# Altium footprint library SparkFun-Retired.PCBLIB: 302 footprints (part 16 of 19)
Each footprint in its own frame and in the unit in brackets; x right, y up, seen from the top. Pads: shape width x height; smd on the part's side, far side on the other; paste and mask are expansions set on the pad; w line width, h text height; cw(c..) or ccw(c..) is an arc to the next point about the centre after c.
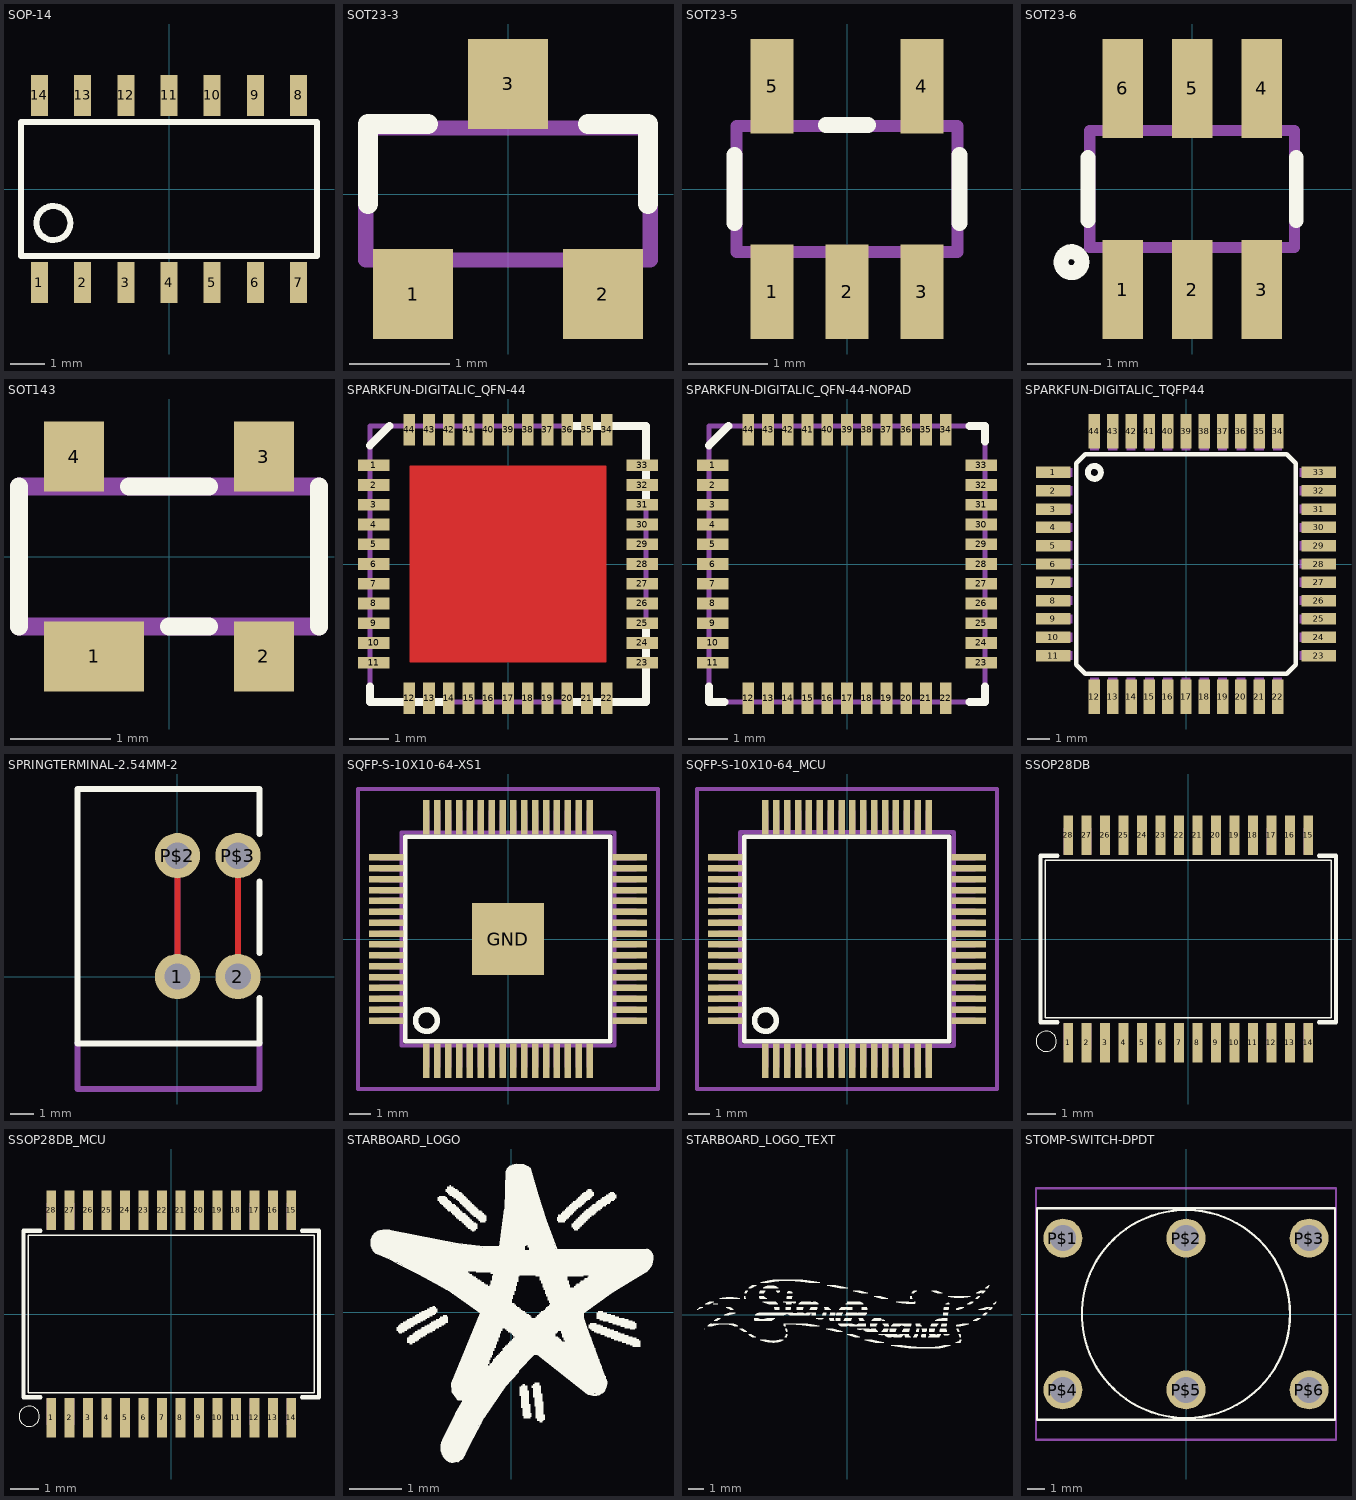
[diagram p15: the footprints below, top view; thin cyan lines are the x and y axes]

## SOP-14 [mil]
pads (14):
  rect 19.69x47.24 smd: 1(-150,-108.27) 2(-100,-108.27) 3(-50,-108.27) 4(0,-108.27) 5(50,-108.27) 6(100,-108.27) 7(150,-108.27) 8(150,108.27) 9(100,108.27) 10(50,108.27) 11(0,108.27) 12(-50,108.27) 13(-100,108.27) 14(-150,108.27)
Top Overlay:
  circle w7: c-133.86,-39.37 r19.69
  lines w7: -171.26,-77.76 171.26,-77.76 171.26,77.76 -171.26,77.76 -171.26,-77.76
Mechanical 16:
  rectangle: -7.87,94.49 7.87,118.11
  rectangle: -57.87,94.49 -42.13,118.11
  rectangle: -107.87,94.49 -92.13,118.11
  rectangle: -157.87,94.49 -142.13,118.11
  rectangle: 42.13,94.49 57.87,118.11
  rectangle: 92.13,94.49 107.87,118.11
  rectangle: 142.13,94.49 157.87,118.11
  region: -142.13,-94.49 -157.87,-94.49 -157.87,-118.11 -142.13,-118.11
  region: -92.13,-94.49 -107.87,-94.49 -107.87,-118.11 -92.13,-118.11
  region: -42.13,-94.49 -57.87,-94.49 -57.87,-118.11 -42.13,-118.11
  region: 7.87,-94.49 -7.87,-94.49 -7.87,-118.11 7.87,-118.11
  region: 57.87,-94.49 42.13,-94.49 42.13,-118.11 57.87,-118.11
  region: 107.87,-94.49 92.13,-94.49 92.13,-118.11 107.87,-118.11
  region: 157.87,-94.49 142.13,-94.49 142.13,-118.11 157.87,-118.11

## SOT23-3 [mil]
pads (3):
  rect 31.5x35.43 smd: 1(-37.4,-39.37) 2(37.4,-39.37) 3(0,43.31)
Top Overlay:
  lines w8: -55.12,-3.94 -55.12,27.56 -31.5,27.56 ; 31.5,27.56 55.12,27.56 55.12,-3.94
Mechanical 16:
  lines w6: -56,-26 56,-26 56,26 -56,26 -56,-26

## SOT23-5 [mil]
pads (5):
  rect 21.65x47.24 smd: 1(-37.4,-51.19) 2(0,-51.19) 3(37.4,-51.19) 4(37.4,51.19) 5(-37.4,51.19)
Top Overlay:
  lines w8: -56,-16.91 -56,16.91 ; -10.57,31.91 10.57,31.91 ; 56,-16.91 56,16.91
Mechanical 16:
  rectangle: -47.24,-59.06 -27.56,-33.46
  rectangle: -9.84,-59.06 9.84,-33.46
  rectangle: 27.56,-59.06 47.24,-33.46
  rectangle: 27.56,33.46 47.24,59.06
  rectangle: -47.24,33.46 -27.56,59.06
  lines w6: -55.12,-31.5 55.12,-31.5 55.12,31.5 -55.12,31.5 -55.12,-31.5

## SOT23-6 [mm]
pads (6):
  rect 0.55x1.35 smd: 1(-0.95,-1.375) 2(0,-1.375) 3(0.95,-1.375) 4(0.95,1.375) 5(0,1.375) 6(-0.95,1.375)
Top Overlay:
  circle w0.203: c-1.65,-1 r0.144
  lines w0.203: -1.422,-0.43 -1.422,0.43 ; 1.422,-0.43 1.422,0.43
Mechanical 16:
  rectangle: -1.2,-1.5 -0.7,-0.85
  rectangle: -0.25,-1.5 0.25,-0.85
  rectangle: 0.7,-1.5 1.2,-0.85
  rectangle: 0.7,0.85 1.2,1.5
  rectangle: -1.2,0.85 -0.7,1.5
  rectangle: -0.25,0.85 0.25,1.5
  lines w0.152: -1.4,-0.8 1.4,-0.8 1.4,0.8 -1.4,0.8 -1.4,-0.8

## SOT143 [mm]
pads (4):
  rect 1x0.7 smd: 1(-0.75,-1)
  rect 0.6x0.7 smd: 2(0.95,-1) 3(0.95,1) 4(-0.95,1)
Top Overlay:
  lines w0.178: -1.5,-0.7 -1.5,0.7 ; -0.4,0.7 0.4,0.7 ; 0,-0.7 0.4,-0.7 ; 1.5,-0.7 1.5,0.7
Mechanical 16:
  lines w0.178: -1.5,-0.7 -1.5,0.7 1.5,0.7 1.5,-0.7 -1.5,-0.7

## SPARKFUN-DIGITALIC_QFN-44 [mil]
pads (44):
  rect 31.5x11.81 smd: 1(-133.86,98.43) 2(-133.86,78.74) 3(-133.86,59.06) 4(-133.86,39.37) 5(-133.86,19.69) 6(-133.86,0) 7(-133.86,-19.69) 8(-133.86,-39.37) 9(-133.86,-59.06) 10(-133.86,-78.74) 11(-133.86,-98.43) 23(133.86,-98.43) 24(133.86,-78.74) 25(133.86,-59.06) 26(133.86,-39.37) 27(133.86,-19.69) 28(133.86,0) 29(133.86,19.69) 30(133.86,39.37) 31(133.86,59.06) 32(133.86,78.74) 33(133.86,98.43)
  rect 11.81x31.5 smd: 12(-98.43,-133.86) 13(-78.74,-133.86) 14(-59.06,-133.86) 15(-39.37,-133.86) 16(-19.69,-133.86) 17(0,-133.86) 18(19.69,-133.86) 19(39.37,-133.86) 20(59.06,-133.86) 21(78.74,-133.86) 22(98.43,-133.86) 34(98.43,133.86) 35(78.74,133.86) 36(59.06,133.86) 37(39.37,133.86) 38(19.69,133.86) 39(0,133.86) 40(-19.69,133.86) 41(-39.37,133.86) 42(-59.06,133.86) 43(-78.74,133.86) 44(-98.43,133.86)
Top Layer:
  rectangle: -98.43,-98.43 98.43,98.43
Top Overlay:
  lines w8: -137.8,-122.05 -137.8,-137.8 -64.96,-137.8 ; -137.8,118.11 -118.11,137.8 ; 64.96,-137.8 137.8,-137.8 137.8,-64.96 ; 64.96,137.8 137.8,137.8 137.8,64.96
Top Solder:
  rectangle: -19.69,-19.69 19.69,19.69
Mechanical 16:
  lines w5: -137.8,-137.8 -137.8,137.8 137.8,137.8 137.8,-137.8 -133.86,-137.8

## SPARKFUN-DIGITALIC_QFN-44-NOPAD [mil]
pads (44):
  rect 31.5x11.81 smd: 1(-133.86,98.43) 2(-133.86,78.74) 3(-133.86,59.06) 4(-133.86,39.37) 5(-133.86,19.69) 6(-133.86,0) 7(-133.86,-19.69) 8(-133.86,-39.37) 9(-133.86,-59.06) 10(-133.86,-78.74) 11(-133.86,-98.43) 23(133.86,-98.43) 24(133.86,-78.74) 25(133.86,-59.06) 26(133.86,-39.37) 27(133.86,-19.69) 28(133.86,0) 29(133.86,19.69) 30(133.86,39.37) 31(133.86,59.06) 32(133.86,78.74) 33(133.86,98.43)
  rect 11.81x31.5 smd: 12(-98.43,-133.86) 13(-78.74,-133.86) 14(-59.06,-133.86) 15(-39.37,-133.86) 16(-19.69,-133.86) 17(0,-133.86) 18(19.69,-133.86) 19(39.37,-133.86) 20(59.06,-133.86) 21(78.74,-133.86) 22(98.43,-133.86) 34(98.43,133.86) 35(78.74,133.86) 36(59.06,133.86) 37(39.37,133.86) 38(19.69,133.86) 39(0,133.86) 40(-19.69,133.86) 41(-39.37,133.86) 42(-59.06,133.86) 43(-78.74,133.86) 44(-98.43,133.86)
Top Overlay:
  lines w8: -137.8,-122.05 -137.8,-137.8 -122.05,-137.8 ; -137.8,118.11 -118.11,137.8 ; 122.05,-137.8 137.8,-137.8 137.8,-122.05 ; 122.05,137.8 137.8,137.8 137.8,122.05
Mechanical 16:
  lines w5: -137.8,-137.8 -137.8,137.8 137.8,137.8 137.8,-137.8 -133.86,-137.8

## SPARKFUN-DIGITALIC_TQFP44 [mil]
pads (44):
  rect 59.06x19.69 smd: 1(-228.35,157.48) 2(-228.35,125.98) 3(-228.35,94.49) 4(-228.35,62.99) 5(-228.35,31.5) 6(-228.35,0) 7(-228.35,-31.5) 8(-228.35,-62.99) 9(-228.35,-94.49) 10(-228.35,-125.98) 11(-228.35,-157.48) 23(228.35,-157.48) 24(228.35,-125.98) 25(228.35,-94.49) 26(228.35,-62.99) 27(228.35,-31.5) 28(228.35,0) 29(228.35,31.5) 30(228.35,62.99) 31(228.35,94.49) 32(228.35,125.98) 33(228.35,157.48)
  rect 19.69x59.06 smd: 12(-157.48,-228.35) 13(-125.98,-228.35) 14(-94.49,-228.35) 15(-62.99,-228.35) 16(-31.5,-228.35) 17(0,-228.35) 18(31.5,-228.35) 19(62.99,-228.35) 20(94.49,-228.35) 21(125.98,-228.35) 22(157.48,-228.35) 34(157.48,228.35) 35(125.98,228.35) 36(94.49,228.35) 37(62.99,228.35) 38(31.5,228.35) 39(0,228.35) 40(-31.5,228.35) 41(-62.99,228.35) 42(-94.49,228.35) 43(-125.98,228.35) 44(-157.48,228.35)
Top Overlay:
  circle w10: c-157.48,157.48 r11.13
  lines w8: -188.98,-173.23 -173.23,-188.98 173.23,-188.98 188.98,-173.23 188.98,173.23 173.23,188.98 -173.23,188.98 -188.98,173.23 -188.98,-173.23
Mechanical 16:
  rectangle: -240.16,149.61 -194.88,165.35
  rectangle: -240.16,118.11 -194.88,133.86
  rectangle: -240.16,86.61 -194.88,102.36
  rectangle: -240.16,55.12 -194.88,70.87
  rectangle: -240.16,23.62 -194.88,39.37
  rectangle: -240.16,-7.87 -194.88,7.87
  rectangle: -240.16,-39.37 -194.88,-23.62
  rectangle: -240.16,-70.87 -194.88,-55.12
  rectangle: -240.16,-102.36 -194.88,-86.61
  rectangle: -240.16,-133.86 -194.88,-118.11
  rectangle: -240.16,-165.35 -194.88,-149.61
  rectangle: -165.35,-240.16 -149.61,-194.88
  rectangle: -133.86,-240.16 -118.11,-194.88
  rectangle: -102.36,-240.16 -86.61,-194.88
  rectangle: -70.87,-240.16 -55.12,-194.88
  rectangle: -39.37,-240.16 -23.62,-194.88
  rectangle: -7.87,-240.16 7.87,-194.88
  rectangle: 23.62,-240.16 39.37,-194.88
  rectangle: 55.12,-240.16 70.87,-194.88
  rectangle: 86.61,-240.16 102.36,-194.88
  rectangle: 118.11,-240.16 133.86,-194.88
  rectangle: 149.61,-240.16 165.35,-194.88
  rectangle: 194.88,-165.35 240.16,-149.61
  rectangle: 194.88,-133.86 240.16,-118.11
  rectangle: 194.88,-102.36 240.16,-86.61
  rectangle: 194.88,-70.87 240.16,-55.12
  rectangle: 194.88,-39.37 240.16,-23.62
  rectangle: 194.88,-7.87 240.16,7.87
  rectangle: 194.88,23.62 240.16,39.37
  rectangle: 194.88,55.12 240.16,70.87
  rectangle: 194.88,86.61 240.16,102.36
  rectangle: 194.88,118.11 240.16,133.86
  rectangle: 194.88,149.61 240.16,165.35
  rectangle: 149.61,194.88 165.35,240.16
  rectangle: 118.11,194.88 133.86,240.16
  rectangle: 86.61,194.88 102.36,240.16
  rectangle: 55.12,194.88 70.87,240.16
  rectangle: 23.62,194.88 39.37,240.16
  rectangle: -7.87,194.88 7.87,240.16
  rectangle: -39.37,194.88 -23.62,240.16
  rectangle: -70.87,194.88 -55.12,240.16
  rectangle: -102.36,194.88 -86.61,240.16
  rectangle: -133.86,194.88 -118.11,240.16
  rectangle: -165.35,194.88 -149.61,240.16

## SPRINGTERMINAL-2.54MM-2 [mil]
pads (4):
  round 74.8 hole 43.31: 1(0,0) 2(100,0) P$2(0,200) P$3(100,200)
Top Layer:
  lines w10: 0,0 0,200 ; 100,0 100,200
Bottom Layer:
  lines w10: 0,0 0,200 ; 100,0 100,200
Top Overlay:
  lines w10: 135.43,-35.43 135.43,-110.24 -165.35,-110.24 -165.35,310.24 135.43,310.24 135.43,236.22 ; 135.43,39.37 135.43,157.48
Mechanical 16:
  lines w10: -165.35,-110.24 -165.35,-185.83 135.43,-185.83 135.43,-110.24

## SQFP-S-10X10-64-XS1 [mil]
pads (65):
  rect 11.81x62.99 smd: 1(-147.64,-220.47) 2(-127.95,-220.47) 3(-108.27,-220.47) 4(-88.58,-220.47) 5(-68.9,-220.47) 6(-49.21,-220.47) 7(-29.53,-220.47) 8(-9.84,-220.47) 9(9.84,-220.47) 10(29.53,-220.47) 11(49.21,-220.47) 12(68.9,-220.47) 13(88.58,-220.47) 14(108.27,-220.47) 15(127.95,-220.47) 16(147.64,-220.47) 33(147.64,220.47) 34(127.95,220.47) 35(108.27,220.47) 36(88.58,220.47) 37(68.9,220.47) 38(49.21,220.47) 39(29.53,220.47) 40(9.84,220.47) 41(-9.84,220.47) 42(-29.53,220.47) 43(-49.21,220.47) 44(-68.9,220.47) 45(-88.58,220.47) 46(-108.27,220.47) 47(-127.95,220.47) 48(-147.64,220.47)
  rect 62.99x11.81 smd: 17(220.47,-147.64) 18(220.47,-127.95) 19(220.47,-108.27) 20(220.47,-88.58) 21(220.47,-68.9) 22(220.47,-49.21) 23(220.47,-29.53) 24(220.47,-9.84) 25(220.47,9.84) 26(220.47,29.53) 27(220.47,49.21) 28(220.47,68.9) 29(220.47,88.58) 30(220.47,108.27) 31(220.47,127.95) 32(220.47,147.64) 49(-220.47,147.64) 50(-220.47,127.95) 51(-220.47,108.27) 52(-220.47,88.58) 53(-220.47,68.9) 54(-220.47,49.21) 55(-220.47,29.53) 56(-220.47,9.84) 57(-220.47,-9.84) 58(-220.47,-29.53) 59(-220.47,-49.21) 60(-220.47,-68.9) 61(-220.47,-88.58) 62(-220.47,-108.27) 63(-220.47,-127.95) 64(-220.47,-147.64)
  rect 129.92x129.92 smd: GND(0,0)
Top Overlay:
  circle w10: c-147.64,-147.64 r19.69
  lines w8: -185.83,-185.43 185.43,-185.43 185.43,185.43 -185.83,185.43 -185.83,-185.43
Top Paste:
  rectangle: -238.9,142.3 -198.7,153
  rectangle: -248.3,122.6 -208.1,133.3
  rectangle: -238.9,102.9 -198.7,113.6
  rectangle: -248.3,83.2 -208.1,93.9
  rectangle: -238.9,63.6 -198.7,74.3
  rectangle: -248.3,43.9 -208.1,54.6
  rectangle: -238.9,24.4 -198.7,35.1
  rectangle: -248.3,4.7 -208.1,15.4
  rectangle: -238.9,-15.2 -198.7,-4.5
  rectangle: -248.3,-34.9 -208.1,-24.2
  rectangle: -238.9,-54.5 -198.7,-43.8
  rectangle: -248.3,-74.2 -208.1,-63.5
  rectangle: -238.9,-93.9 -198.7,-83.2
  rectangle: -248.3,-113.6 -208.1,-102.9
  rectangle: -238.9,-133.2 -198.7,-122.5
  rectangle: -248.3,-152.9 -208.1,-142.2
  rectangle: 208.2,142.2 248.4,152.9
  rectangle: 198.8,122.5 239,133.2
  rectangle: 208.2,102.8 248.4,113.5
  rectangle: 198.8,83.1 239,93.8
  rectangle: 208.2,63.5 248.4,74.2
  rectangle: 198.8,43.8 239,54.5
  rectangle: 208.2,24.3 248.4,35
  rectangle: 198.8,4.6 239,15.3
  rectangle: 208.2,-15.3 248.4,-4.6
  rectangle: 198.8,-35 239,-24.3
  rectangle: 208.2,-54.6 248.4,-43.9
  rectangle: 198.8,-74.3 239,-63.6
  rectangle: 208.2,-94 248.4,-83.3
  rectangle: 198.8,-113.7 239,-103
  rectangle: 208.2,-133.3 248.4,-122.6
  rectangle: 198.8,-153 239,-142.3
  region: -142.2,208.4 -142.2,248.6 -152.9,248.6 -152.9,208.4
  region: -122.5,199 -122.5,239.2 -133.2,239.2 -133.2,199
  region: -102.8,208.4 -102.8,248.6 -113.5,248.6 -113.5,208.4
  region: -83.1,199 -83.1,239.2 -93.8,239.2 -93.8,199
  region: -63.5,208.4 -63.5,248.6 -74.2,248.6 -74.2,208.4
  region: -43.8,199 -43.8,239.2 -54.5,239.2 -54.5,199
  region: -24.3,208.4 -24.3,248.6 -35,248.6 -35,208.4
  region: -4.6,199 -4.6,239.2 -15.3,239.2 -15.3,199
  region: 15.3,208.4 15.3,248.6 4.6,248.6 4.6,208.4
  region: 35,199 35,239.2 24.3,239.2 24.3,199
  region: 54.6,208.4 54.6,248.6 43.9,248.6 43.9,208.4
  region: 74.3,199 74.3,239.2 63.6,239.2 63.6,199
  region: 94,208.4 94,248.6 83.3,248.6 83.3,208.4
  region: 113.7,199 113.7,239.2 103,239.2 103,199
  region: 133.3,208.4 133.3,248.6 122.6,248.6 122.6,208.4
  region: 153,199 153,239.2 142.3,239.2 142.3,199
  region: -142.3,-237.5 -142.3,-197.3 -153,-197.3 -153,-237.5
  region: -122.6,-246.9 -122.6,-206.7 -133.3,-206.7 -133.3,-246.9
  region: -102.9,-237.5 -102.9,-197.3 -113.6,-197.3 -113.6,-237.5
  region: -83.2,-246.9 -83.2,-206.7 -93.9,-206.7 -93.9,-246.9
  region: -63.6,-237.5 -63.6,-197.3 -74.3,-197.3 -74.3,-237.5
  region: -43.9,-246.9 -43.9,-206.7 -54.6,-206.7 -54.6,-246.9
  region: -24.4,-237.5 -24.4,-197.3 -35.1,-197.3 -35.1,-237.5
  region: -4.7,-246.9 -4.7,-206.7 -15.4,-206.7 -15.4,-246.9
  region: 15.2,-237.5 15.2,-197.3 4.5,-197.3 4.5,-237.5
  region: 34.9,-246.9 34.9,-206.7 24.2,-206.7 24.2,-246.9
  region: 54.5,-237.5 54.5,-197.3 43.8,-197.3 43.8,-237.5
  region: 74.2,-246.9 74.2,-206.7 63.5,-206.7 63.5,-246.9
  region: 93.9,-237.5 93.9,-197.3 83.2,-197.3 83.2,-237.5
  region: 113.6,-246.9 113.6,-206.7 102.9,-206.7 102.9,-246.9
  region: 133.2,-237.5 133.2,-197.3 122.5,-197.3 122.5,-237.5
  region: 152.9,-246.9 152.9,-206.7 142.2,-206.7 142.2,-246.9
Mechanical 16:
  rectangle: -232.28,82.68 -188.98,94.49
  rectangle: -232.28,102.36 -188.98,114.17
  rectangle: -232.28,141.73 -188.98,153.54
  rectangle: -232.28,122.05 -188.98,133.86
  rectangle: -232.28,3.94 -188.98,15.75
  rectangle: -232.28,23.62 -188.98,35.43
  rectangle: -232.28,62.99 -188.98,74.8
  rectangle: -232.28,43.31 -188.98,55.12
  rectangle: -232.28,-74.8 -188.98,-62.99
  rectangle: -232.28,-55.12 -188.98,-43.31
  rectangle: -232.28,-15.75 -188.98,-3.94
  rectangle: -232.28,-35.43 -188.98,-23.62
  rectangle: -232.28,-153.54 -188.98,-141.73
  rectangle: -232.28,-133.86 -188.98,-122.05
  rectangle: -232.28,-94.49 -188.98,-82.68
  rectangle: -232.28,-114.17 -188.98,-102.36
  region: -82.68,-232.28 -82.68,-188.97 -94.5,-188.97 -94.5,-232.28
  region: -102.35,-232.28 -102.35,-188.97 -114.17,-188.97 -114.17,-232.28
  region: -141.72,-232.28 -141.72,-188.97 -153.54,-188.97 -153.54,-232.28
  region: -122.05,-232.28 -122.05,-188.97 -133.87,-188.97 -133.87,-232.28
  region: -3.94,-232.28 -3.94,-188.97 -15.75,-188.97 -15.75,-232.28
  region: -23.62,-232.28 -23.62,-188.97 -35.43,-188.97 -35.43,-232.28
  region: -62.98,-232.28 -62.98,-188.97 -74.8,-188.97 -74.8,-232.28
  region: -43.31,-232.28 -43.31,-188.97 -55.12,-188.97 -55.12,-232.28
  region: 74.8,-232.28 74.8,-188.97 62.98,-188.97 62.98,-232.28
  region: 55.12,-232.28 55.12,-188.97 43.31,-188.97 43.31,-232.28
  region: 15.75,-232.28 15.75,-188.97 3.94,-188.97 3.94,-232.28
  region: 35.43,-232.28 35.43,-188.97 23.62,-188.97 23.62,-232.28
  region: 153.54,-232.28 153.54,-188.97 141.72,-188.97 141.72,-232.28
  region: 133.87,-232.28 133.87,-188.97 122.05,-188.97 122.05,-232.28
  region: 94.5,-232.28 94.5,-188.97 82.68,-188.97 82.68,-232.28
  region: 114.17,-232.28 114.17,-188.97 102.35,-188.97 102.35,-232.28
  rectangle: 188.98,82.68 232.28,94.49
  rectangle: 188.98,102.36 232.28,114.17
  rectangle: 188.98,141.73 232.28,153.54
  rectangle: 188.98,122.05 232.28,133.86
  rectangle: 188.98,3.94 232.28,15.75
  rectangle: 188.98,23.62 232.28,35.43
  rectangle: 188.98,62.99 232.28,74.8
  rectangle: 188.98,43.31 232.28,55.12
  rectangle: 188.98,-74.8 232.28,-62.99
  rectangle: 188.98,-55.12 232.28,-43.31
  rectangle: 188.98,-15.75 232.28,-3.94
  rectangle: 188.98,-35.43 232.28,-23.62
  rectangle: 188.98,-153.54 232.28,-141.73
  rectangle: 188.98,-133.86 232.28,-122.05
  rectangle: 188.98,-94.49 232.28,-82.68
  rectangle: 188.98,-114.17 232.28,-102.36
  region: -82.68,188.97 -82.68,232.28 -94.5,232.28 -94.5,188.97
  region: -102.35,188.97 -102.35,232.28 -114.17,232.28 -114.17,188.97
  region: -141.72,188.97 -141.72,232.28 -153.54,232.28 -153.54,188.97
  region: -122.05,188.97 -122.05,232.28 -133.87,232.28 -133.87,188.97
  region: -3.94,188.97 -3.94,232.28 -15.75,232.28 -15.75,188.97
  region: -23.62,188.97 -23.62,232.28 -35.43,232.28 -35.43,188.97
  region: -62.98,188.97 -62.98,232.28 -74.8,232.28 -74.8,188.97
  region: -43.31,188.97 -43.31,232.28 -55.12,232.28 -55.12,188.97
  region: 74.8,188.97 74.8,232.28 62.98,232.28 62.98,188.97
  region: 55.12,188.97 55.12,232.28 43.31,232.28 43.31,188.97
  region: 15.75,188.97 15.75,232.28 3.94,232.28 3.94,188.97
  region: 35.43,188.97 35.43,232.28 23.62,232.28 23.62,188.97
  region: 153.54,188.97 153.54,232.28 141.72,232.28 141.72,188.97
  region: 133.87,188.97 133.87,232.28 122.05,232.28 122.05,188.97
  region: 94.5,188.97 94.5,232.28 82.68,232.28 82.68,188.97
  region: 114.17,188.97 114.17,232.28 102.35,232.28 102.35,188.97
  lines w5: -192.91,188.98 -192.91,192.91
  lines w8: -192.91,-192.91 -192.91,192.91 192.91,192.91 192.91,-192.91 -192.91,-192.91
Mechanical 27:
  lines w7.87: -271.65,-271.65 -271.65,271.65 271.65,271.65 271.65,-271.65 -271.65,-271.65

## SQFP-S-10X10-64_MCU [mil]
pads (64):
  rect 11.81x62.99 smd: 1(-147.64,-220.47) 2(-127.95,-220.47) 3(-108.27,-220.47) 4(-88.58,-220.47) 5(-68.9,-220.47) 6(-49.21,-220.47) 7(-29.53,-220.47) 8(-9.84,-220.47) 9(9.84,-220.47) 10(29.53,-220.47) 11(49.21,-220.47) 12(68.9,-220.47) 13(88.58,-220.47) 14(108.27,-220.47) 15(127.95,-220.47) 16(147.64,-220.47) 33(147.64,220.47) 34(127.95,220.47) 35(108.27,220.47) 36(88.58,220.47) 37(68.9,220.47) 38(49.21,220.47) 39(29.53,220.47) 40(9.84,220.47) 41(-9.84,220.47) 42(-29.53,220.47) 43(-49.21,220.47) 44(-68.9,220.47) 45(-88.58,220.47) 46(-108.27,220.47) 47(-127.95,220.47) 48(-147.64,220.47)
  rect 62.99x11.81 smd: 17(220.47,-147.64) 18(220.47,-127.95) 19(220.47,-108.27) 20(220.47,-88.58) 21(220.47,-68.9) 22(220.47,-49.21) 23(220.47,-29.53) 24(220.47,-9.84) 25(220.47,9.84) 26(220.47,29.53) 27(220.47,49.21) 28(220.47,68.9) 29(220.47,88.58) 30(220.47,108.27) 31(220.47,127.95) 32(220.47,147.64) 49(-220.47,147.64) 50(-220.47,127.95) 51(-220.47,108.27) 52(-220.47,88.58) 53(-220.47,68.9) 54(-220.47,49.21) 55(-220.47,29.53) 56(-220.47,9.84) 57(-220.47,-9.84) 58(-220.47,-29.53) 59(-220.47,-49.21) 60(-220.47,-68.9) 61(-220.47,-88.58) 62(-220.47,-108.27) 63(-220.47,-127.95) 64(-220.47,-147.64)
Top Overlay:
  circle w10: c-147.64,-147.64 r19.69
  lines w8: -185.83,-185.43 185.43,-185.43 185.43,185.43 -185.83,185.43 -185.83,-185.43
Top Paste:
  rectangle: -238.9,142.3 -198.7,153
  rectangle: -248.3,122.6 -208.1,133.3
  rectangle: -238.9,102.9 -198.7,113.6
  rectangle: -248.3,83.2 -208.1,93.9
  rectangle: -238.9,63.6 -198.7,74.3
  rectangle: -248.3,43.9 -208.1,54.6
  rectangle: -238.9,24.4 -198.7,35.1
  rectangle: -248.3,4.7 -208.1,15.4
  rectangle: -238.9,-15.2 -198.7,-4.5
  rectangle: -248.3,-34.9 -208.1,-24.2
  rectangle: -238.9,-54.5 -198.7,-43.8
  rectangle: -248.3,-74.2 -208.1,-63.5
  rectangle: -238.9,-93.9 -198.7,-83.2
  rectangle: -248.3,-113.6 -208.1,-102.9
  rectangle: -238.9,-133.2 -198.7,-122.5
  rectangle: -248.3,-152.9 -208.1,-142.2
  rectangle: 208.2,142.2 248.4,152.9
  rectangle: 198.8,122.5 239,133.2
  rectangle: 208.2,102.8 248.4,113.5
  rectangle: 198.8,83.1 239,93.8
  rectangle: 208.2,63.5 248.4,74.2
  rectangle: 198.8,43.8 239,54.5
  rectangle: 208.2,24.3 248.4,35
  rectangle: 198.8,4.6 239,15.3
  rectangle: 208.2,-15.3 248.4,-4.6
  rectangle: 198.8,-35 239,-24.3
  rectangle: 208.2,-54.6 248.4,-43.9
  rectangle: 198.8,-74.3 239,-63.6
  rectangle: 208.2,-94 248.4,-83.3
  rectangle: 198.8,-113.7 239,-103
  rectangle: 208.2,-133.3 248.4,-122.6
  rectangle: 198.8,-153 239,-142.3
  region: -142.2,208.4 -142.2,248.6 -152.9,248.6 -152.9,208.4
  region: -122.5,199 -122.5,239.2 -133.2,239.2 -133.2,199
  region: -102.8,208.4 -102.8,248.6 -113.5,248.6 -113.5,208.4
  region: -83.1,199 -83.1,239.2 -93.8,239.2 -93.8,199
  region: -63.5,208.4 -63.5,248.6 -74.2,248.6 -74.2,208.4
  region: -43.8,199 -43.8,239.2 -54.5,239.2 -54.5,199
  region: -24.3,208.4 -24.3,248.6 -35,248.6 -35,208.4
  region: -4.6,199 -4.6,239.2 -15.3,239.2 -15.3,199
  region: 15.3,208.4 15.3,248.6 4.6,248.6 4.6,208.4
  region: 35,199 35,239.2 24.3,239.2 24.3,199
  region: 54.6,208.4 54.6,248.6 43.9,248.6 43.9,208.4
  region: 74.3,199 74.3,239.2 63.6,239.2 63.6,199
  region: 94,208.4 94,248.6 83.3,248.6 83.3,208.4
  region: 113.7,199 113.7,239.2 103,239.2 103,199
  region: 133.3,208.4 133.3,248.6 122.6,248.6 122.6,208.4
  region: 153,199 153,239.2 142.3,239.2 142.3,199
  region: -142.3,-237.5 -142.3,-197.3 -153,-197.3 -153,-237.5
  region: -122.6,-246.9 -122.6,-206.7 -133.3,-206.7 -133.3,-246.9
  region: -102.9,-237.5 -102.9,-197.3 -113.6,-197.3 -113.6,-237.5
  region: -83.2,-246.9 -83.2,-206.7 -93.9,-206.7 -93.9,-246.9
  region: -63.6,-237.5 -63.6,-197.3 -74.3,-197.3 -74.3,-237.5
  region: -43.9,-246.9 -43.9,-206.7 -54.6,-206.7 -54.6,-246.9
  region: -24.4,-237.5 -24.4,-197.3 -35.1,-197.3 -35.1,-237.5
  region: -4.7,-246.9 -4.7,-206.7 -15.4,-206.7 -15.4,-246.9
  region: 15.2,-237.5 15.2,-197.3 4.5,-197.3 4.5,-237.5
  region: 34.9,-246.9 34.9,-206.7 24.2,-206.7 24.2,-246.9
  region: 54.5,-237.5 54.5,-197.3 43.8,-197.3 43.8,-237.5
  region: 74.2,-246.9 74.2,-206.7 63.5,-206.7 63.5,-246.9
  region: 93.9,-237.5 93.9,-197.3 83.2,-197.3 83.2,-237.5
  region: 113.6,-246.9 113.6,-206.7 102.9,-206.7 102.9,-246.9
  region: 133.2,-237.5 133.2,-197.3 122.5,-197.3 122.5,-237.5
  region: 152.9,-246.9 152.9,-206.7 142.2,-206.7 142.2,-246.9
Mechanical 16:
  rectangle: -153.54,-232.28 -141.73,-194.88
  rectangle: -133.86,-232.28 -122.05,-194.88
  rectangle: -114.17,-232.28 -102.36,-194.88
  rectangle: -94.49,-232.28 -82.68,-194.88
  rectangle: -74.8,-232.28 -62.99,-194.88
  rectangle: -55.12,-232.28 -43.31,-194.88
  rectangle: -35.43,-232.28 -23.62,-194.88
  rectangle: -15.75,-232.28 -3.94,-194.88
  rectangle: 3.94,-232.28 15.75,-194.88
  rectangle: 23.62,-232.28 35.43,-194.88
  rectangle: 43.31,-232.28 55.12,-194.88
  rectangle: 62.99,-232.28 74.8,-194.88
  rectangle: 82.68,-232.28 94.49,-194.88
  rectangle: 102.36,-232.28 114.17,-194.88
  rectangle: 122.05,-232.28 133.86,-194.88
  rectangle: 141.73,-232.28 153.54,-194.88
  rectangle: 194.88,-153.54 232.28,-141.73
  rectangle: 194.88,-133.86 232.28,-122.05
  rectangle: 194.88,-114.17 232.28,-102.36
  rectangle: 194.88,-94.49 232.28,-82.68
  rectangle: 194.88,-74.8 232.28,-62.99
  rectangle: 194.88,-55.12 232.28,-43.31
  rectangle: 194.88,-35.43 232.28,-23.62
  rectangle: 194.88,-15.75 232.28,-3.94
  rectangle: 194.88,3.94 232.28,15.75
  rectangle: 194.88,23.62 232.28,35.43
  rectangle: 194.88,43.31 232.28,55.12
  rectangle: 194.88,62.99 232.28,74.8
  rectangle: 194.88,82.68 232.28,94.49
  rectangle: 194.88,102.36 232.28,114.17
  rectangle: 194.88,122.05 232.28,133.86
  rectangle: 194.88,141.73 232.28,153.54
  rectangle: 141.73,194.88 153.54,232.28
  rectangle: 122.05,194.88 133.86,232.28
  rectangle: 102.36,194.88 114.17,232.28
  rectangle: 82.68,194.88 94.49,232.28
  rectangle: 62.99,194.88 74.8,232.28
  rectangle: 43.31,194.88 55.12,232.28
  rectangle: 23.62,194.88 35.43,232.28
  rectangle: 3.94,194.88 15.75,232.28
  rectangle: -15.75,194.88 -3.94,232.28
  rectangle: -35.43,194.88 -23.62,232.28
  rectangle: -55.12,194.88 -43.31,232.28
  rectangle: -74.8,194.88 -62.99,232.28
  rectangle: -94.49,194.88 -82.68,232.28
  rectangle: -114.17,194.88 -102.36,232.28
  rectangle: -133.86,194.88 -122.05,232.28
  rectangle: -153.54,194.88 -141.73,232.28
  rectangle: -232.28,141.73 -194.88,153.54
  rectangle: -232.28,122.05 -194.88,133.86
  rectangle: -232.28,102.36 -194.88,114.17
  rectangle: -232.28,82.68 -194.88,94.49
  rectangle: -232.28,62.99 -194.88,74.8
  rectangle: -232.28,43.31 -194.88,55.12
  rectangle: -232.28,23.62 -194.88,35.43
  rectangle: -232.28,3.94 -194.88,15.75
  rectangle: -232.28,-15.75 -194.88,-3.94
  rectangle: -232.28,-35.43 -194.88,-23.62
  rectangle: -232.28,-55.12 -194.88,-43.31
  rectangle: -232.28,-74.8 -194.88,-62.99
  rectangle: -232.28,-94.49 -194.88,-82.68
  rectangle: -232.28,-114.17 -194.88,-102.36
  rectangle: -232.28,-133.86 -194.88,-122.05
  rectangle: -232.28,-153.54 -194.88,-141.73
  lines w8: -193.31,-193.31 193.31,-193.31 193.31,193.31 -193.31,193.31 -193.31,-193.31
Mechanical 27:
  lines w7.87: -271.65,-271.65 -271.65,271.65 271.65,271.65 271.65,-271.65 -271.65,-271.65

## SSOP28DB [mil]
pads (28):
  rect 13.7x55 smd: 1(-166.34,-143.94) 2(-140.75,-143.94) 3(-115.16,-143.94) 4(-89.57,-143.94) 5(-63.98,-143.94) 6(-38.39,-143.94) 7(-12.8,-143.94) 8(12.8,-143.94) 9(38.39,-143.94) 10(63.98,-143.94) 11(89.57,-143.94) 12(115.16,-143.94) 13(140.75,-143.94) 14(166.34,-143.94) 15(166.34,143.94) 16(140.75,143.94) 17(115.16,143.94) 18(89.57,143.94) 19(63.98,143.94) 20(38.39,143.94) 21(12.8,143.94) 22(-12.8,143.94) 23(-38.39,143.94) 24(-63.98,143.94) 25(-89.57,143.94) 26(-115.16,143.94) 27(-140.75,143.94) 28(-166.34,143.94)
Top Overlay:
  circle w0: c-196.85,-141.73 r14.14
  lines w2: -198.35,-108.78 198.35,-108.78 198.35,108.78 -198.35,108.78 -198.35,-108.78
  lines w6: -181.1,-115.16 -204.72,-115.16 -204.72,115.16 -181.1,115.16 ; 181.1,-115.16 204.72,-115.16 204.72,115.16 181.1,115.16
Mechanical 16:
  rectangle: -172.74,116.76 -159.94,153.54
  rectangle: -172.74,-153.54 -159.94,-116.76
  rectangle: -147.15,-153.54 -134.35,-116.76
  rectangle: -121.56,-153.54 -108.76,-116.76
  rectangle: -147.15,116.76 -134.35,153.54
  rectangle: -121.56,116.76 -108.76,153.54
  rectangle: -95.96,116.76 -83.17,153.54
  rectangle: -70.37,116.76 -57.58,153.54
  rectangle: -44.78,116.76 -31.99,153.54
  rectangle: -19.19,116.76 -6.4,153.54
  rectangle: 6.4,116.76 19.19,153.54
  rectangle: 31.99,116.76 44.78,153.54
  rectangle: 57.58,116.76 70.37,153.54
  rectangle: 83.17,116.76 95.96,153.54
  rectangle: 108.76,116.76 121.56,153.54
  rectangle: 134.35,116.76 147.15,153.54
  rectangle: 159.94,116.76 172.74,153.54
  rectangle: -95.96,-153.54 -83.17,-116.76
  rectangle: -70.37,-153.54 -57.58,-116.76
  rectangle: -44.78,-153.54 -31.99,-116.76
  rectangle: -19.19,-153.54 -6.4,-116.76
  rectangle: 6.4,-153.54 19.19,-116.76
  rectangle: 31.99,-153.54 44.78,-116.76
  rectangle: 57.58,-153.54 70.37,-116.76
  rectangle: 83.17,-153.54 95.96,-116.76
  rectangle: 108.76,-153.54 121.56,-116.76
  rectangle: 134.35,-153.54 147.15,-116.76
  rectangle: 159.94,-153.54 172.74,-116.76

## SSOP28DB_MCU [mil]
pads (28):
  rect 13.7x55 smd: 1(-166.34,-143.94) 2(-140.75,-143.94) 3(-115.16,-143.94) 4(-89.57,-143.94) 5(-63.98,-143.94) 6(-38.39,-143.94) 7(-12.8,-143.94) 8(12.8,-143.94) 9(38.39,-143.94) 10(63.98,-143.94) 11(89.57,-143.94) 12(115.16,-143.94) 13(140.75,-143.94) 14(166.34,-143.94) 15(166.34,143.94) 16(140.75,143.94) 17(115.16,143.94) 18(89.57,143.94) 19(63.98,143.94) 20(38.39,143.94) 21(12.8,143.94) 22(-12.8,143.94) 23(-38.39,143.94) 24(-63.98,143.94) 25(-89.57,143.94) 26(-115.16,143.94) 27(-140.75,143.94) 28(-166.34,143.94)
Top Overlay:
  circle w0: c-196.85,-141.73 r14.14
  lines w2: -198.35,-108.78 198.35,-108.78 198.35,108.78 -198.35,108.78 -198.35,-108.78
  lines w6: -181.1,-115.16 -204.72,-115.16 -204.72,115.16 -181.1,115.16 ; 181.1,-115.16 204.72,-115.16 204.72,115.16 181.1,115.16
Mechanical 16:
  rectangle: -172.74,116.76 -159.94,153.54
  rectangle: -172.74,-153.54 -159.94,-116.76
  rectangle: -147.15,-153.54 -134.35,-116.76
  rectangle: -121.56,-153.54 -108.76,-116.76
  rectangle: -147.15,116.76 -134.35,153.54
  rectangle: -121.56,116.76 -108.76,153.54
  rectangle: -95.96,116.76 -83.17,153.54
  rectangle: -70.37,116.76 -57.58,153.54
  rectangle: -44.78,116.76 -31.99,153.54
  rectangle: -19.19,116.76 -6.4,153.54
  rectangle: 6.4,116.76 19.19,153.54
  rectangle: 31.99,116.76 44.78,153.54
  rectangle: 57.58,116.76 70.37,153.54
  rectangle: 83.17,116.76 95.96,153.54
  rectangle: 108.76,116.76 121.56,153.54
  rectangle: 134.35,116.76 147.15,153.54
  rectangle: 159.94,116.76 172.74,153.54
  rectangle: -95.96,-153.54 -83.17,-116.76
  rectangle: -70.37,-153.54 -57.58,-116.76
  rectangle: -44.78,-153.54 -31.99,-116.76
  rectangle: -19.19,-153.54 -6.4,-116.76
  rectangle: 6.4,-153.54 19.19,-116.76
  rectangle: 31.99,-153.54 44.78,-116.76
  rectangle: 57.58,-153.54 70.37,-116.76
  rectangle: 83.17,-153.54 95.96,-116.76
  rectangle: 108.76,-153.54 121.56,-116.76
  rectangle: 134.35,-153.54 147.15,-116.76
  rectangle: 159.94,-153.54 172.74,-116.76

## STARBOARD_LOGO [mil]
Top Overlay:
  drawing of 713 lines, arcs and shapes, not listed

## STARBOARD_LOGO_TEXT [mil]
Top Overlay:
  drawing of 3589 lines, arcs and shapes, not listed

## STOMP-SWITCH-DPDT [mil]
pads (6):
  round 88.59 hole 59.06: P$1(-279.53,172.24) P$2(0,172.24) P$3(279.53,172.24) P$4(-279.53,-172.24) P$5(0,-172.24) P$6(279.53,-172.24)
Top Overlay:
  circle w5: c0,0 r236.22
  lines w5: -338.58,-240.16 -338.58,240.16 338.58,240.16 338.58,-240.16 -338.58,-240.16
Mechanical 16:
  lines w5: -340.55,-285.43 340.55,-285.43 340.55,285.43 -340.55,285.43 -340.55,-285.43